# Altium schematic symbol library LATTICEPLDS_Library.SchLib: 291 symbols (part 14 of 32) (continued)
## LFE3-70E-FN1156 (continued)
part L pins: AA12 VCCAUX (power), AA13 VCC (power), AA22 VCC (power), AA23 VCCAUX (power), AB13 VCC (power), AB14 VCC (power), AB15 VCC (power), AB16 VCC (power), AB17 VCC (power), AB18 VCC (power), AB19 VCC (power), AB20 VCC (power), AB21 VCC (power), AB22 VCC (power), AC13 VCCA (power), AC14 VCCAUX (power), AC15 VCCAUX (power), AC17 VCCA (power), AC18 VCCA (power), AC20 VCCAUX (power), AC21 VCCAUX (power), AC22 VCCA (power), AD13 VCCA (power), AD16 VCCA (power), AD17 VCCA (power), AD18 VCCA (power), AD19 VCCA (power), AD22 VCCA (power), AE12 VCCA (power), AE13 VCCA (power), AE16 VCCA (power), AE19 VCCA (power), AE22 VCCA (power), AE23 VCCA (power), M14 VCCAUX (power), M15 VCCAUX (power), M20 VCCAUX (power), M21 VCCAUX (power), N13 VCC (power), N14 VCC (power), N15 VCC (power), N16 VCC (power), N17 VCC (power), N18 VCC (power), N19 VCC (power), N20 VCC (power), N21 VCC (power), N22 VCC (power), P12 VCCAUX (power), P13 VCC (power), P22 VCC (power), P23 VCCAUX (power), R12 VCCAUX (power), R13 VCC (power), R22 VCC (power), R23 VCCAUX (power), U13 VCC (power), U22 VCC (power), V13 VCC (power), V22 VCC (power), Y12 VCCAUX (power), Y13 VCC (power), Y22 VCC (power), Y23 VCCAUX (power)
part M pins: AA9 NC, AB3 NC, AB4 NC, AB6 NC, AB7 NC, AB8 NC, AB10 NC, AB25 NC, AB26 NC, AB27 NC, AB31 NC, AB32 NC, AC1 NC, AC2 NC, AC4 NC, AC5 NC, AC8 NC, AC9 NC, AC10 NC, AC25 NC, AC26 NC, AC27 NC, AC28 NC, AD5 NC, AD7 NC, AD25 NC, AD26 NC, AD27 NC, AD28 NC, AD29 NC, AD30 NC, AD31 NC, AD33 NC, AD34 NC, AE5 NC, AE6 NC, AE7 NC, AE8 NC, AE14 NC, AE15 NC, AE27 NC, AE28 NC, AE33 NC, AE34 NC, AF1 NC, AF3 NC, AF4 NC, AF6 NC, AF7 NC, AF8 NC, AF11 NC, AF12 NC, AF13 NC, AF27 NC, AF28 NC, AF29 NC, AF34 NC, AG1 NC, AG2 NC, AG3 NC, AG4 NC, AG5 NC, AG6 NC, AG7 NC, AG11 NC, AG12 NC, AG13 NC, AG28 NC, AG29 NC, AG30 NC, AG31 NC, AG32 NC, AG33 NC, AG34 NC, AH1 NC, AH2 NC, AH3 NC, AH4 NC, AH5 NC, AH6 NC, AH8 NC, AH12 NC, AH13 NC, AH29 NC, AH30 NC, AH31 NC, AH32 NC, AH34 NC, AJ1 NC, AJ29 NC, AJ30 NC, AJ32 NC, AK1 NC, AK10 NC, AK11 NC, AK12 NC, AK13 NC, AL10 NC, AL11 NC, AL12 NC, AL13 NC, AN10 NC, AN11 NC, AN12 NC, AN13 NC, AP10 NC, AP11 NC, AP12 NC, AP13 NC, B8 NC, B27 NC, B29 NC, C7 NC, C8 NC, C9 NC, C26 NC, C27 NC, D7 NC, D8 NC, D9 NC, D26 NC, D27 NC, E6 NC, E7 NC, E8 NC, E14 NC, E16 NC, E25 NC, E27 NC, E28 NC, E29 NC, F4 NC, F5 NC, F6 NC, F7 NC, F8 NC, F9 NC, F15 NC, F16 NC, F24 NC, F25 NC, F26 NC, F27 NC, F28 NC, F29 NC, G6 NC, G7 NC, G8 NC, G9 NC, G10 NC, G14 NC, G15 NC, G22 NC, G24 NC, G27 NC, G28 NC, G29 NC, H6 NC, H7 NC, H9 NC, H10 NC, H11 NC, H12 NC, H21 NC, H24 NC, H28 NC, H29 NC, H30 NC, H31 NC, H32 NC, J4 NC, J6 NC, J7 NC, J8 NC, J9 NC, J10 NC, J11 NC, J24 NC, J25 NC, J26 NC, J27 NC, J28 NC, J29 NC, J31 NC, J32 NC, K1 NC, K2 NC, K3 NC, K4 NC, K5 NC, K6 NC, K7 NC, K11 NC, K25 NC, K26 NC, K27 NC, K28 NC, K29 NC, K30 NC, K31 NC, K32 NC, K33 NC, K34 NC, L1 NC, L2 NC, L4 NC, L5 NC, L6 NC, L7 NC, L8 NC, L9 NC, L10 NC, L25 NC, L26 NC, L27 NC, L28 NC, L30 NC, L31 NC, L32 NC, L33 NC, L34 NC, M1 NC, M2 NC, M3 NC, M4 NC, M7 NC, M8 NC, M9 NC, M25 NC, M26 NC, M27 NC, M28 NC, M29 NC, M30 NC, M31 NC, M33 NC, M34 NC, N9 NC

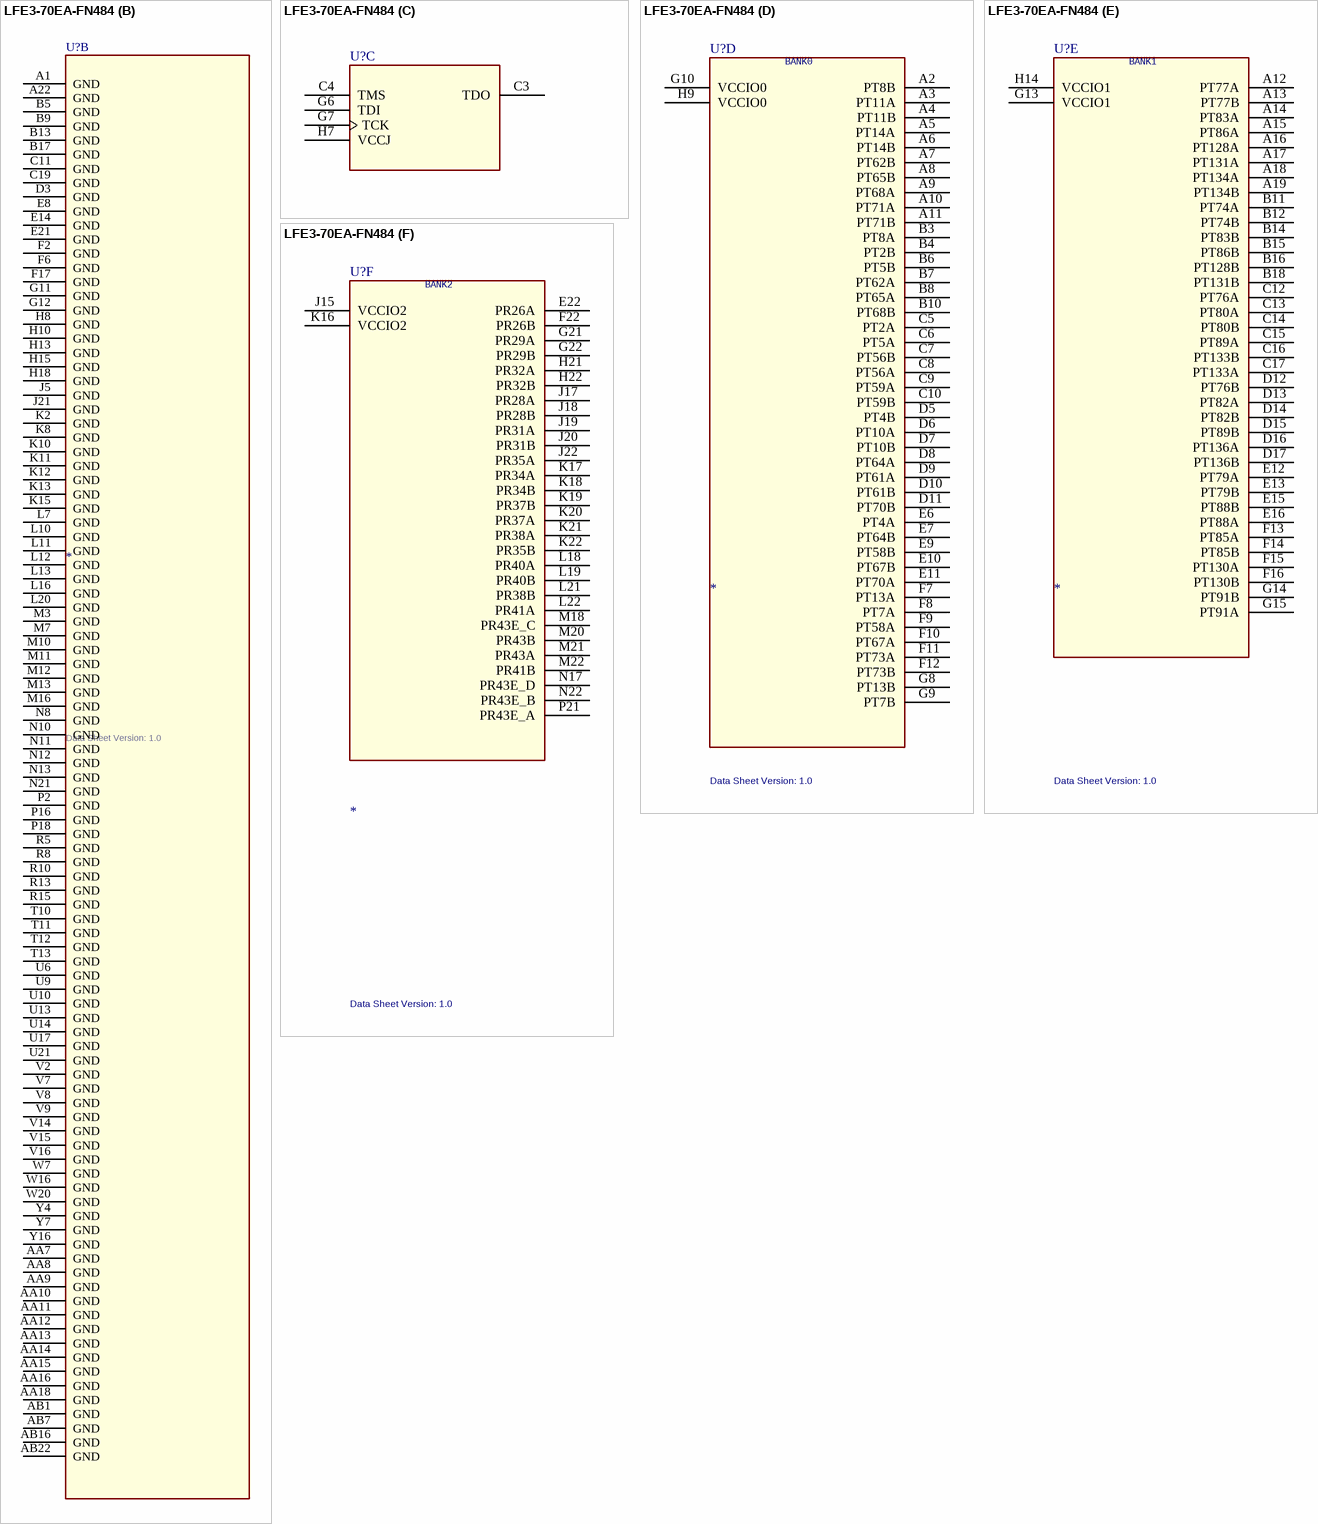
[diagram p140: symbol LFE3-70EA-FN484]

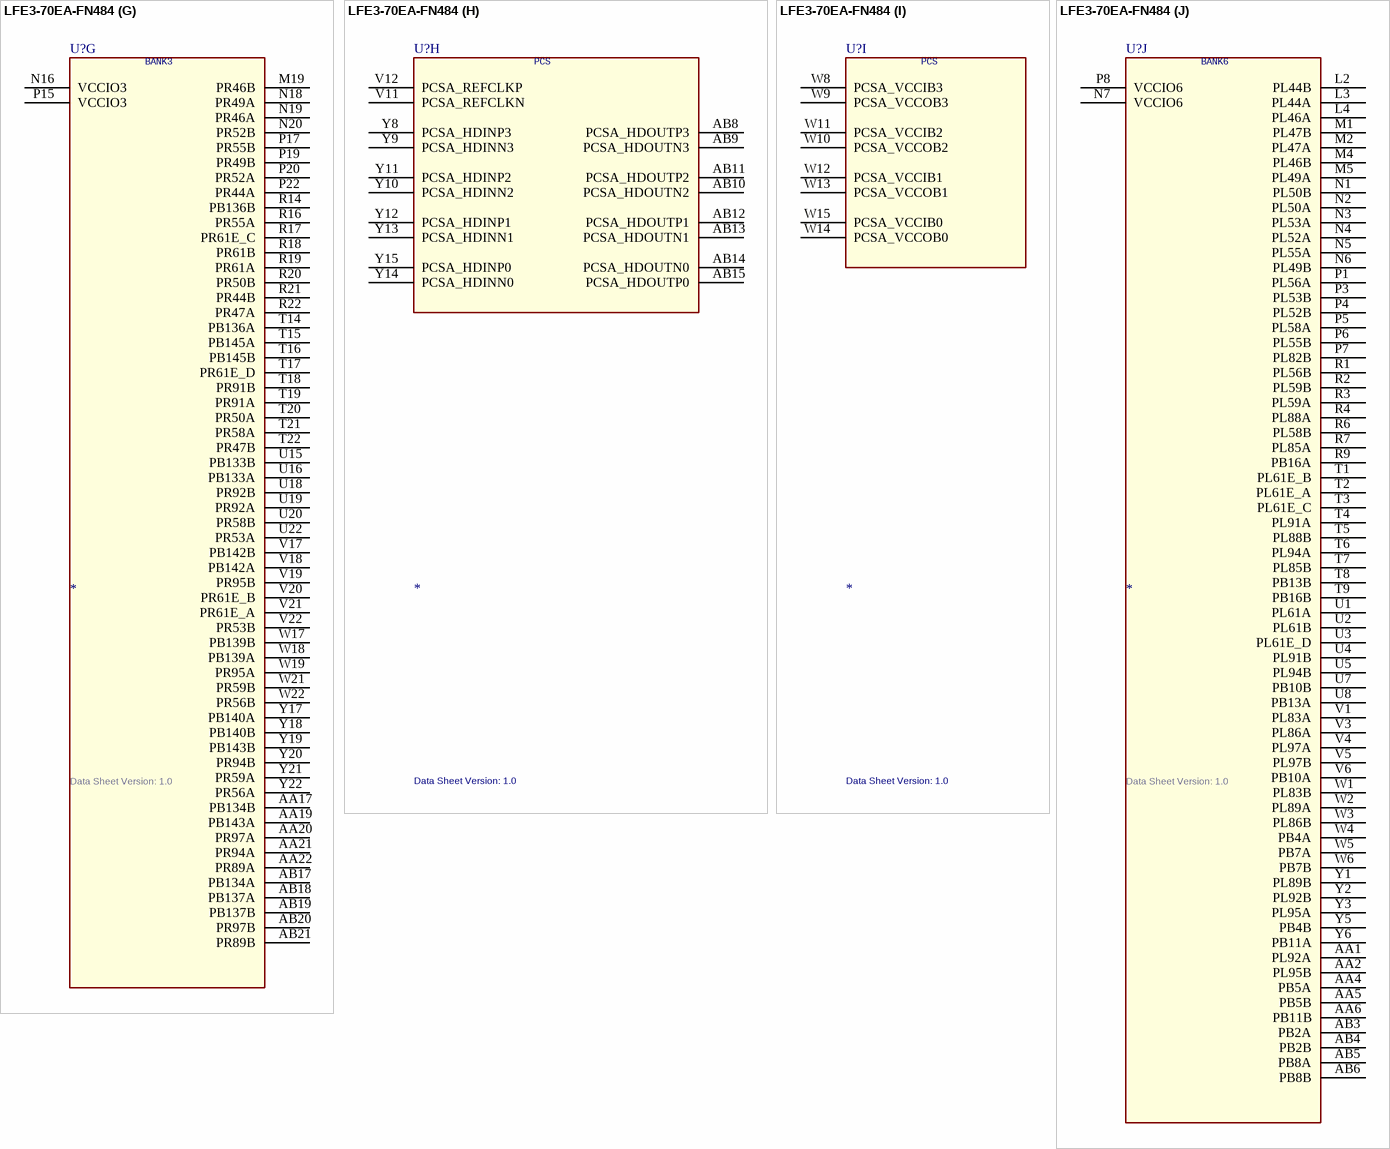
[diagram p141: symbol LFE3-70EA-FN484]

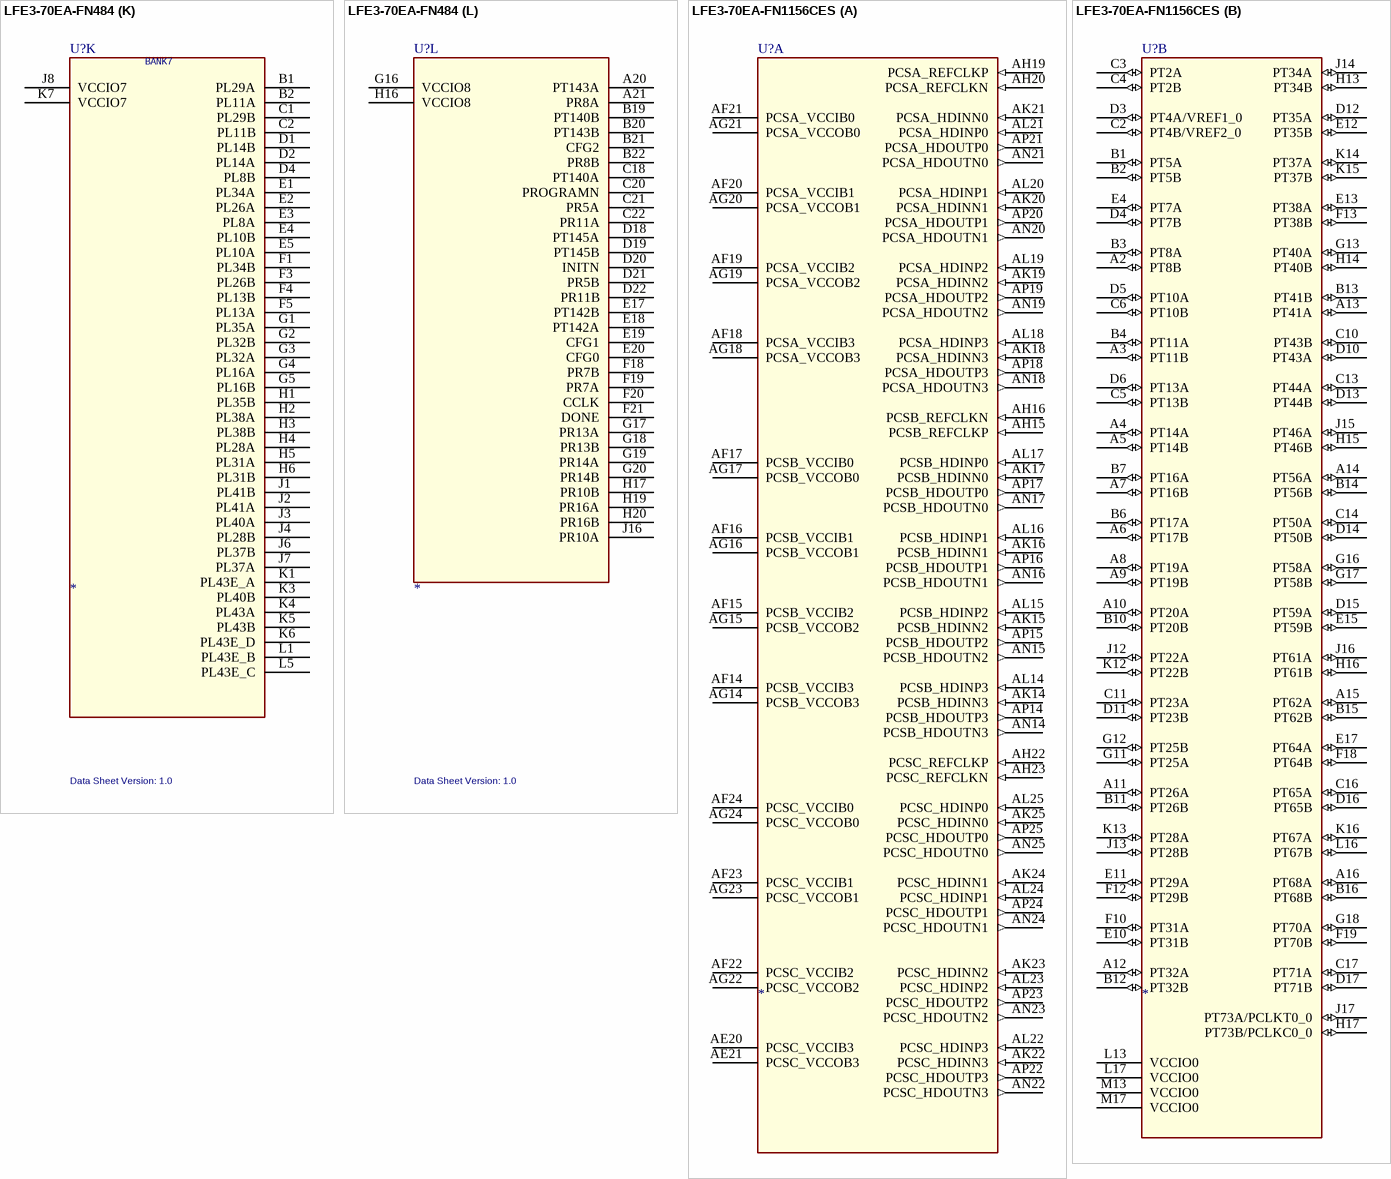
[diagram p142: symbols LFE3-70EA-FN484 to LFE3-70EA-FN1156CES]

## LFE3-70EA-FN484
designator U?  Data Sheet Version: 1.0
SPLIT_INST: TRUE; SWAP_INFO: (S1+S2+S3+S4+S5+S6+S7+S8+S9+S10+S11+S12)
part A pins: AA3 TEMPVSS, AB2 TEMPSENSE, H11 VCCAUX (power), H12 VCCAUX (power), J9 VCC (power), J10 VCC (power), J11 VCC (power), J12 VCC (power), J13 VCC (power), J14 VCC (power), K9 VCCPLL_L (power), K14 VCCPLL_R (power), L6 VTT7 (power), L8 VCCAUX (power), L9 VCC (power), L14 VCC (power), L15 VCCAUX (power), L17 VTT2 (power), M6 VTT6 (power), M8 VCCAUX (power), M9 VCC (power), M14 VCC (power), M15 VCCAUX (power), M17 VTT3 (power), N9 VCCPLL_L (power), N14 VCCPLL_R (power), N15 XRES, P9 VCC (power), P10 VCC (power), P11 VCC (power), P12 VCC (power), P13 VCC (power), P14 VCC (power), R11 VCCAUX (power), R12 VCCAUX (power), U11 VCCA (power), U12 VCCA (power), V10 VCCA (power), V13 VCCA (power)
part B pins: A1 GND (power), A22 GND (power), AA7 GND (power), AA8 GND (power), AA9 GND (power), AA10 GND (power), AA11 GND (power), AA12 GND (power), AA13 GND (power), AA14 GND (power), AA15 GND (power), AA16 GND (power), AA18 GND (power), AB1 GND (power), AB7 GND (power), AB16 GND (power), AB22 GND (power), B5 GND (power), B9 GND (power), B13 GND (power), B17 GND (power), C11 GND (power), C19 GND (power), D3 GND (power), E8 GND (power), E14 GND (power), E21 GND (power), F2 GND (power), F6 GND (power), F17 GND (power), G11 GND (power), G12 GND (power), H8 GND (power), H10 GND (power), H13 GND (power), H15 GND (power), H18 GND (power), J5 GND (power), J21 GND (power), K2 GND (power), K8 GND (power), K10 GND (power), K11 GND (power), K12 GND (power), K13 GND (power), K15 GND (power), L7 GND (power), L10 GND (power), L11 GND (power), L12 GND (power), L13 GND (power), L16 GND (power), L20 GND (power), M3 GND (power), M7 GND (power), M10 GND (power), M11 GND (power), M12 GND (power), M13 GND (power), M16 GND (power), N8 GND (power), N10 GND (power), N11 GND (power), N12 GND (power), N13 GND (power), N21 GND (power), P2 GND (power), P16 GND (power), P18 GND (power), R5 GND (power), R8 GND (power), R10 GND (power), R13 GND (power), R15 GND (power), T10 GND (power), T11 GND (power), T12 GND (power), T13 GND (power), U6 GND (power), U9 GND (power), U10 GND (power), U13 GND (power), U14 GND (power), U17 GND (power), U21 GND (power), V2 GND (power), V7 GND (power), V8 GND (power), V9 GND (power), V14 GND (power), V15 GND (power), V16 GND (power), W7 GND (power), W16 GND (power), W20 GND (power), Y4 GND (power), Y7 GND (power), Y16 GND (power)
part C pins: C3 TDO, C4 TMS, G6 TDI, G7 TCK, H7 VCCJ (power)
part D pins: A2 PT8B, A3 PT11A, A4 PT11B, A5 PT14A, A6 PT14B, A7 PT62B, A8 PT65B, A9 PT68A, A10 PT71A, A11 PT71B, B3 PT8A, B4 PT2B, B6 PT5B, B7 PT62A, B8 PT65A, B10 PT68B, C5 PT2A, C6 PT5A, C7 PT56B, C8 PT56A, C9 PT59A, C10 PT59B, D5 PT4B, D6 PT10A, D7 PT10B, D8 PT64A, D9 PT61A, D10 PT61B, D11 PT70B, E6 PT4A, E7 PT64B, E9 PT58B, E10 PT67B, E11 PT70A, F7 PT13A, F8 PT7A, F9 PT58A, F10 PT67A, F11 PT73A, F12 PT73B, G8 PT13B, G9 PT7B, G10 VCCIO0 (power), H9 VCCIO0 (power)
part E pins: A12 PT77A, A13 PT77B, A14 PT83A, A15 PT86A, A16 PT128A, A17 PT131A, A18 PT134A, A19 PT134B, B11 PT74A, B12 PT74B, B14 PT83B, B15 PT86B, B16 PT128B, B18 PT131B, C12 PT76A, C13 PT80A, C14 PT80B, C15 PT89A, C16 PT133B, C17 PT133A, D12 PT76B, D13 PT82A, D14 PT82B, D15 PT89B, D16 PT136A, D17 PT136B, E12 PT79A, E13 PT79B, E15 PT88B, E16 PT88A, F13 PT85A, F14 PT85B, F15 PT130A, F16 PT130B, G13 VCCIO1 (power), G14 PT91B, G15 PT91A, H14 VCCIO1 (power)
part F pins: E22 PR26A, F22 PR26B, G21 PR29A, G22 PR29B, H21 PR32A, H22 PR32B, J15 VCCIO2 (power), J17 PR28A, J18 PR28B, J19 PR31A, J20 PR31B, J22 PR35A, K16 VCCIO2 (power), K17 PR34A, K18 PR34B, K19 PR37B, K20 PR37A, K21 PR38A, K22 PR35B, L18 PR40A, L19 PR40B, L21 PR38B, L22 PR41A, M18 PR43E_C, M20 PR43B, M21 PR43A, M22 PR41B, N17 PR43E_D, N22 PR43E_B, P21 PR43E_A
part G pins: AA17 PB134B, AA19 PB143A, AA20 PR97A, AA21 PR94A, AA22 PR89A, AB17 PB134A, AB18 PB137A, AB19 PB137B, AB20 PR97B, AB21 PR89B, M19 PR46B, N16 VCCIO3 (power), N18 PR49A, N19 PR46A, N20 PR52B, P15 VCCIO3 (power), P17 PR55B, P19 PR49B, P20 PR52A, P22 PR44A, R14 PB136B, R16 PR55A, R17 PR61E_C, R18 PR61B, R19 PR61A, R20 PR50B, R21 PR44B, R22 PR47A, T14 PB136A, T15 PB145A, T16 PB145B, T17 PR61E_D, T18 PR91B, T19 PR91A, T20 PR50A, T21 PR58A, T22 PR47B, U15 PB133B, U16 PB133A, U18 PR92B, U19 PR92A, U20 PR58B, U22 PR53A, V17 PB142B, V18 PB142A, V19 PR95B, V20 PR61E_B, V21 PR61E_A, V22 PR53B, W17 PB139B, W18 PB139A, W19 PR95A, W21 PR59B, W22 PR56B, Y17 PB140A, Y18 PB140B, Y19 PB143B, Y20 PR94B, Y21 PR59A, Y22 PR56A
part H pins: AB8 PCSA_HDOUTP3, AB9 PCSA_HDOUTN3, AB10 PCSA_HDOUTN2, AB11 PCSA_HDOUTP2, AB12 PCSA_HDOUTP1, AB13 PCSA_HDOUTN1, AB14 PCSA_HDOUTN0, AB15 PCSA_HDOUTP0, V11 PCSA_REFCLKN, V12 PCSA_REFCLKP, Y8 PCSA_HDINP3, Y9 PCSA_HDINN3, Y10 PCSA_HDINN2, Y11 PCSA_HDINP2, Y12 PCSA_HDINP1, Y13 PCSA_HDINN1, Y14 PCSA_HDINN0, Y15 PCSA_HDINP0
part I pins: W8 PCSA_VCCIB3 (power), W9 PCSA_VCCOB3 (power), W10 PCSA_VCCOB2 (power), W11 PCSA_VCCIB2 (power), W12 PCSA_VCCIB1 (power), W13 PCSA_VCCOB1 (power), W14 PCSA_VCCOB0 (power), W15 PCSA_VCCIB0 (power)
part J pins: AA1 PL92A, AA2 PL95B, AA4 PB5A, AA5 PB5B, AA6 PB11B, AB3 PB2A, AB4 PB2B, AB5 PB8A, AB6 PB8B, L2 PL44B, L3 PL44A, L4 PL46A, M1 PL47B, M2 PL47A, M4 PL46B, M5 PL49A, N1 PL50B, N2 PL50A, N3 PL53A, N4 PL52A, N5 PL55A, N6 PL49B, N7 VCCIO6 (power), P1 PL56A, P3 PL53B, P4 PL52B, P5 PL58A, P6 PL55B, P7 PL82B, P8 VCCIO6 (power), R1 PL56B, R2 PL59B, R3 PL59A, R4 PL88A, R6 PL58B, R7 PL85A, R9 PB16A, T1 PL61E_B, T2 PL61E_A, T3 PL61E_C, T4 PL91A, T5 PL88B, T6 PL94A, T7 PL85B, T8 PB13B, T9 PB16B, U1 PL61A, U2 PL61B, U3 PL61E_D, U4 PL91B, U5 PL94B, U7 PB10B, U8 PB13A, V1 PL83A, V3 PL86A, V4 PL97A, V5 PL97B, V6 PB10A, W1 PL83B, W2 PL89A, W3 PL86B, W4 PB4A, W5 PB7A, W6 PB7B, Y1 PL89B, Y2 PL92B, Y3 PL95A, Y5 PB4B, Y6 PB11A
part K pins: B1 PL29A, B2 PL11A, C1 PL29B, C2 PL11B, D1 PL14B, D2 PL14A, D4 PL8B, E1 PL34A, E2 PL26A, E3 PL8A, E4 PL10B, E5 PL10A, F1 PL34B, F3 PL26B, F4 PL13B, F5 PL13A, G1 PL35A, G2 PL32B, G3 PL32A, G4 PL16A, G5 PL16B, H1 PL35B, H2 PL38A, H3 PL38B, H4 PL28A, H5 PL31A, H6 PL31B, J1 PL41B, J2 PL41A, J3 PL40A, J4 PL28B, J6 PL37B, J7 PL37A, J8 VCCIO7 (power), K1 PL43E_A, K3 PL40B, K4 PL43A, K5 PL43B, K6 PL43E_D, K7 VCCIO7 (power), L1 PL43E_B, L5 PL43E_C
part L pins: A20 PT143A, A21 PR8A, B19 PT140B, B20 PT143B, B21 CFG2, B22 PR8B, C18 PT140A, C20 PROGRAMN, C21 PR5A, C22 PR11A, D18 PT145A, D19 PT145B, D20 INITN, D21 PR5B, D22 PR11B, E17 PT142B, E18 PT142A, E19 CFG1, E20 CFG0, F18 PR7B, F19 PR7A, F20 CCLK, F21 DONE, G16 VCCIO8 (power), G17 PR13A, G18 PR13B, G19 PR14A, G20 PR14B, H16 VCCIO8 (power), H17 PR10B, H19 PR16A, H20 PR16B, J16 PR10A
part D text: BANK0
part E text: BANK1
part F text: BANK2
part G text: BANK3
part H text: PCS
part I text: PCS
part J text: BANK6
part K text: BANK7

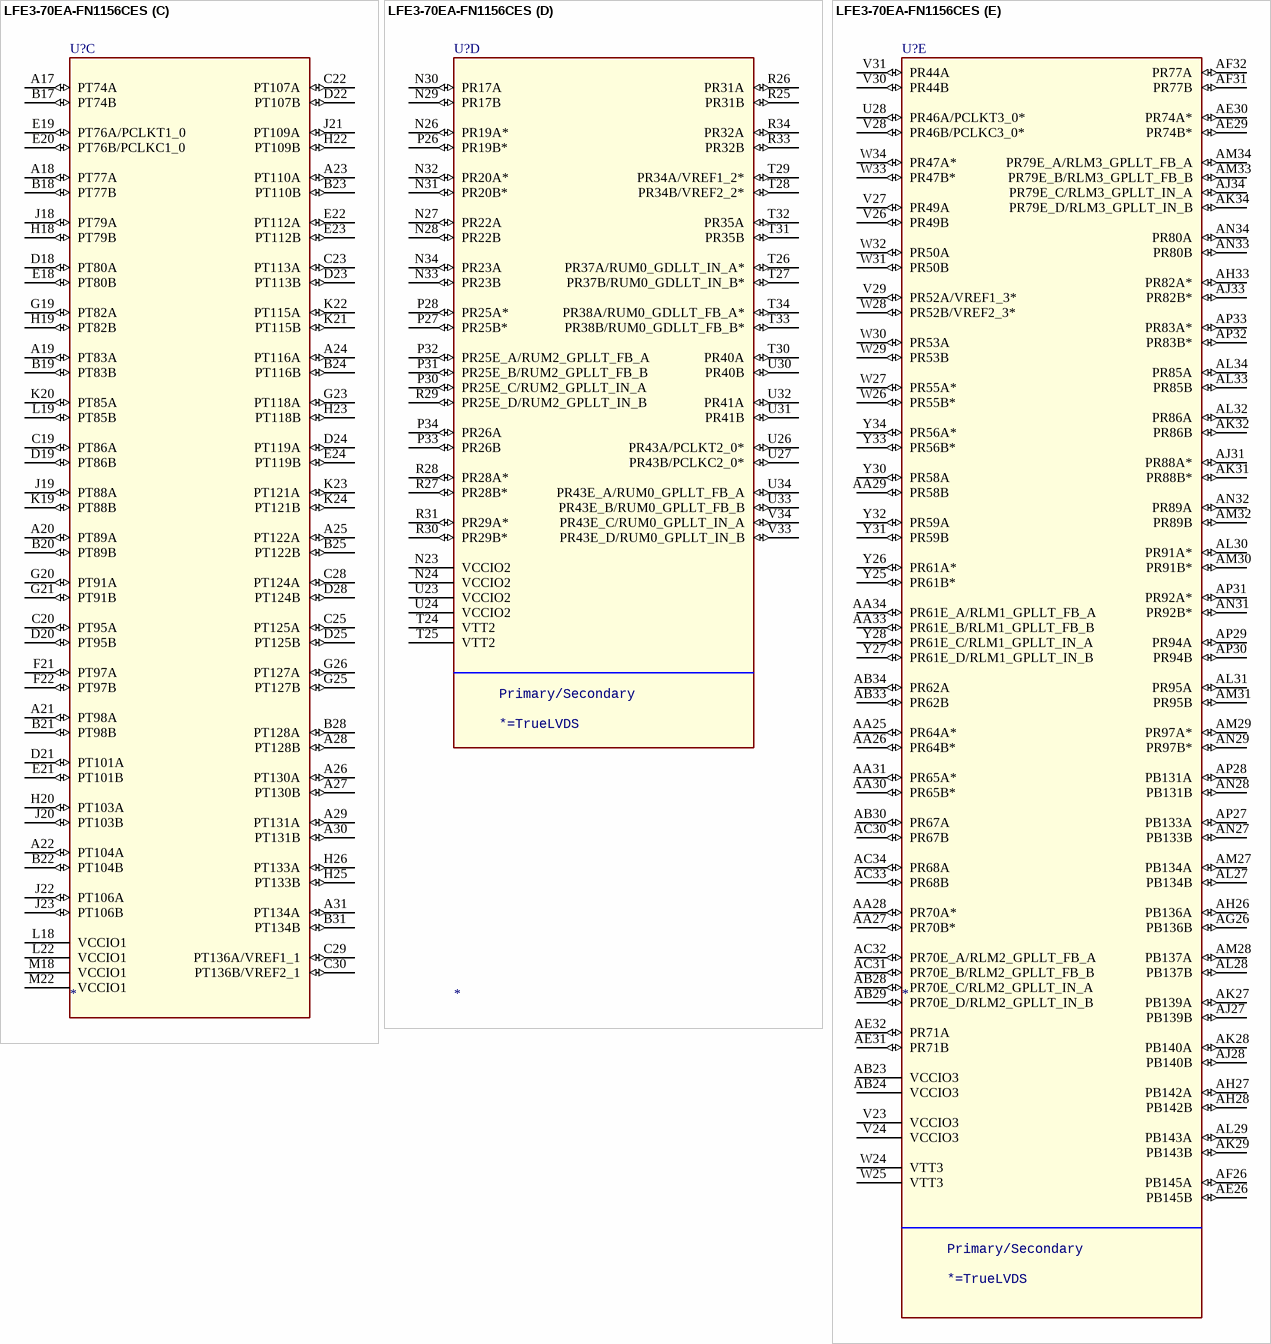
[diagram p143: symbol LFE3-70EA-FN1156CES]

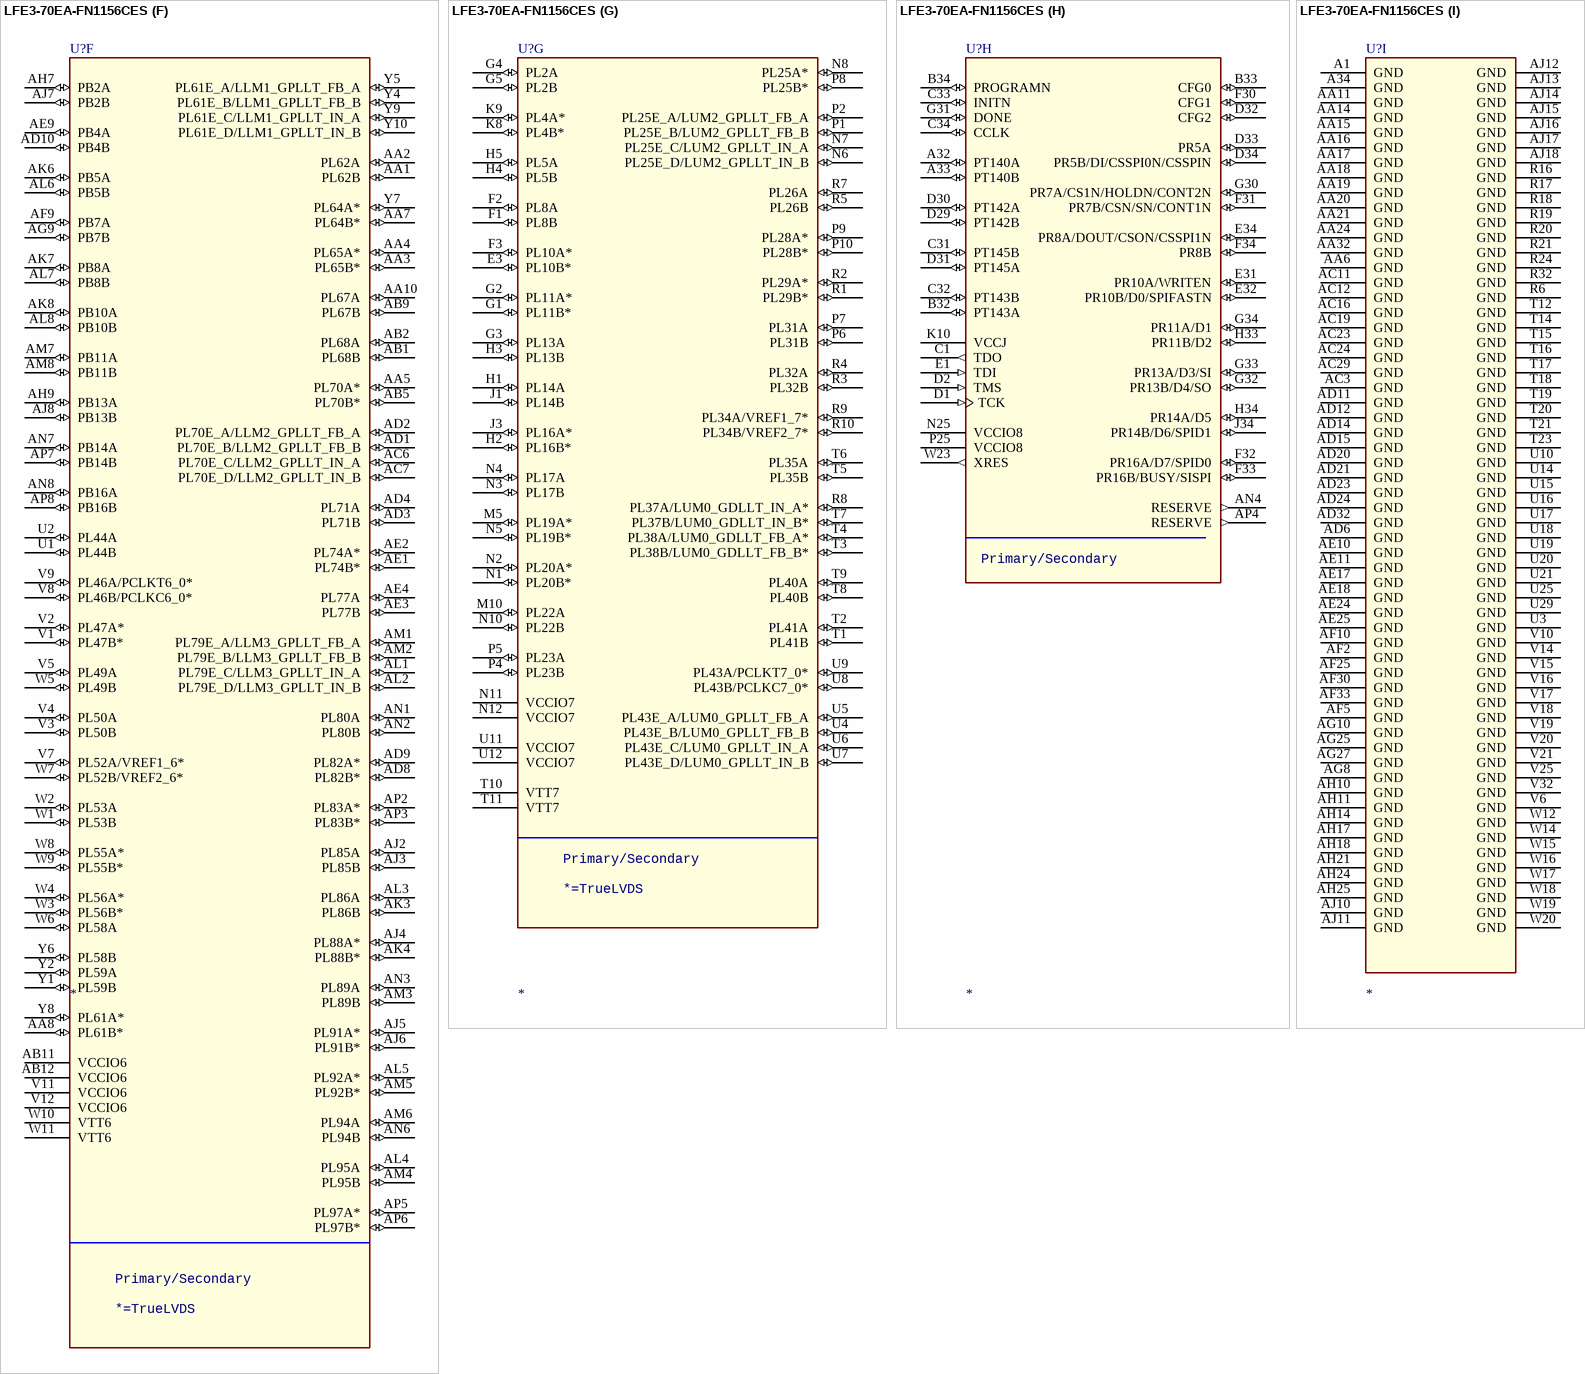
[diagram p144: symbol LFE3-70EA-FN1156CES]

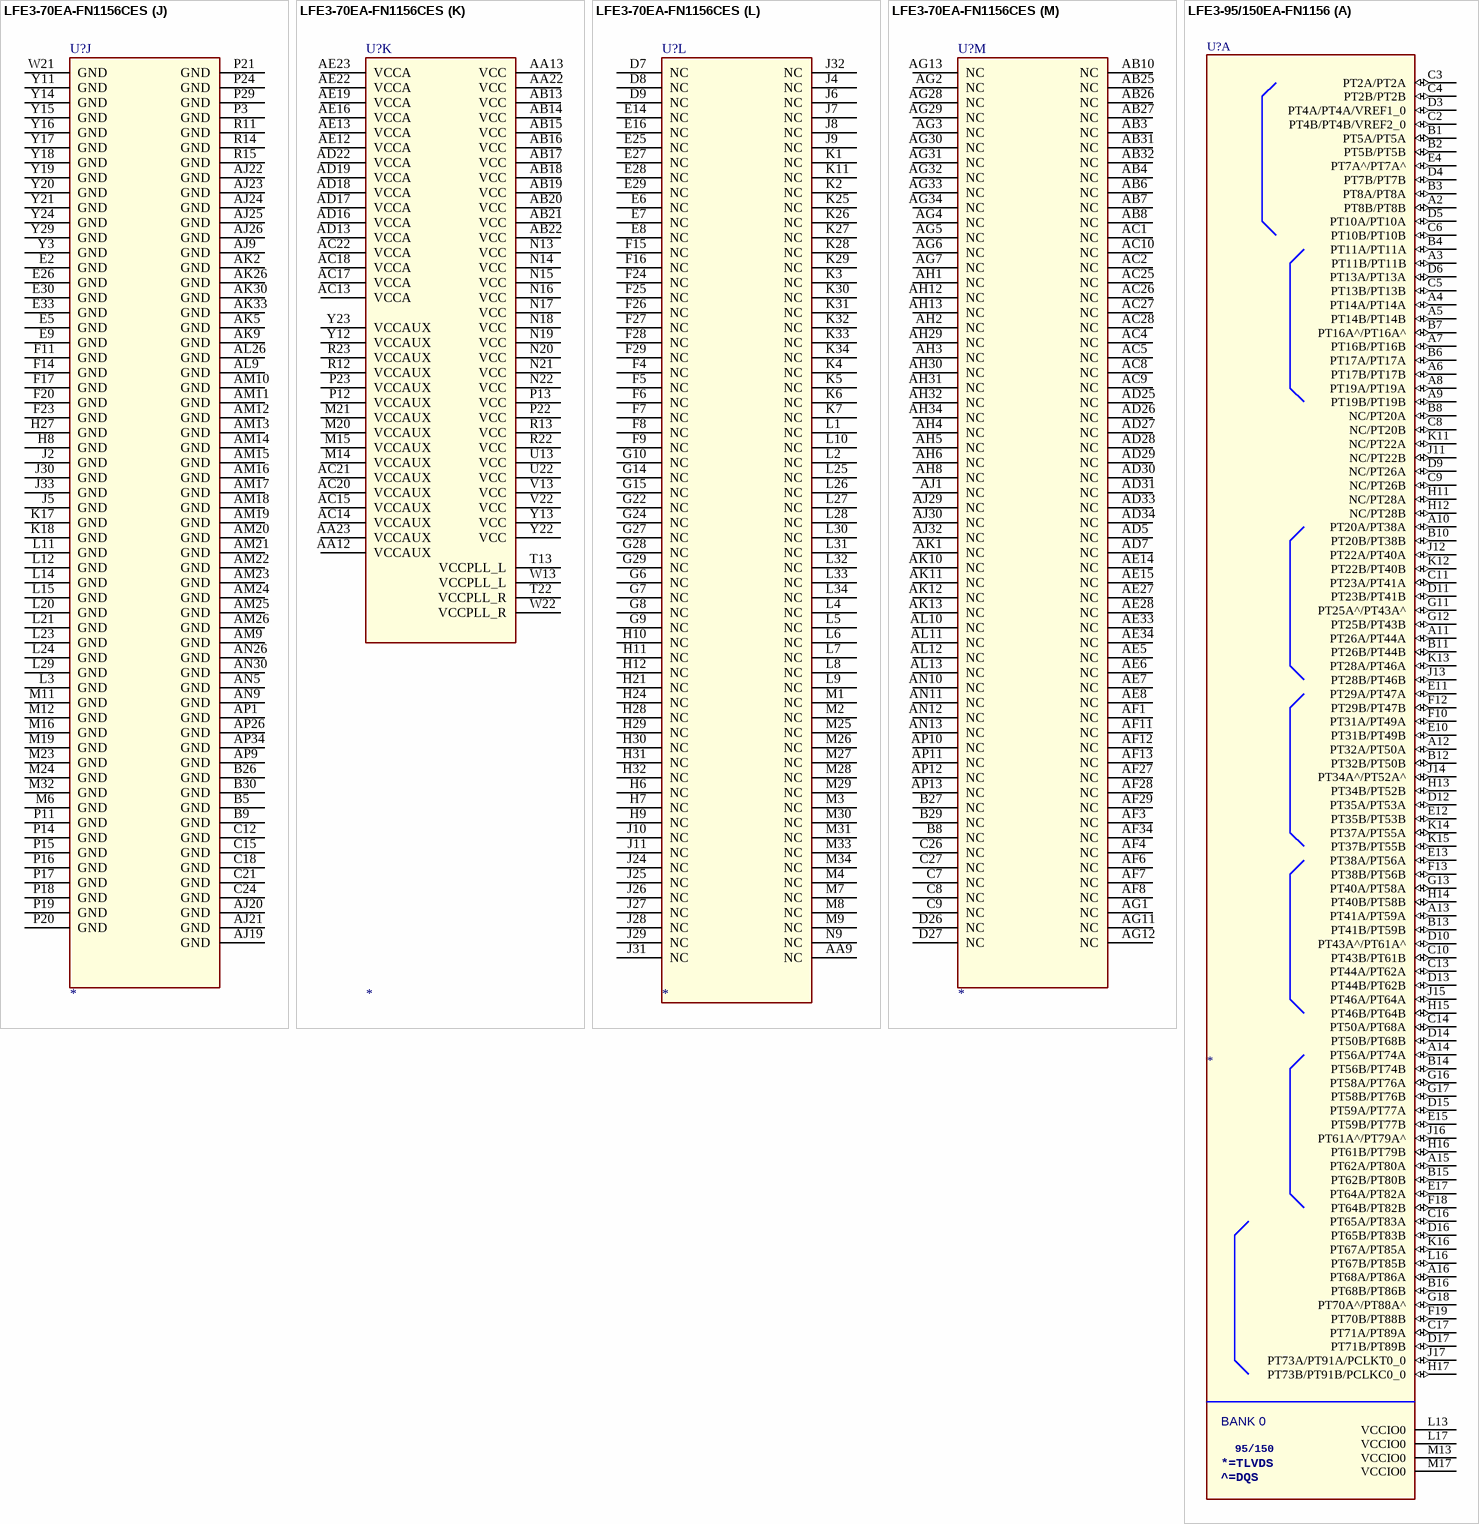
[diagram p145: symbols LFE3-70EA-FN1156CES to LFE3-95/150EA-FN1156]